# Altium footprint library idc.PcbLib: 45 footprints (part 2 of 3)
Each footprint in its own frame and in the unit in brackets; x right, y up, seen from the top. Pads: shape width x height; smd on the part's side, far side on the other; paste and mask are expansions set on the pad; w line width, h text height; cw(c..) or ccw(c..) is an arc to the next point about the centre after c.
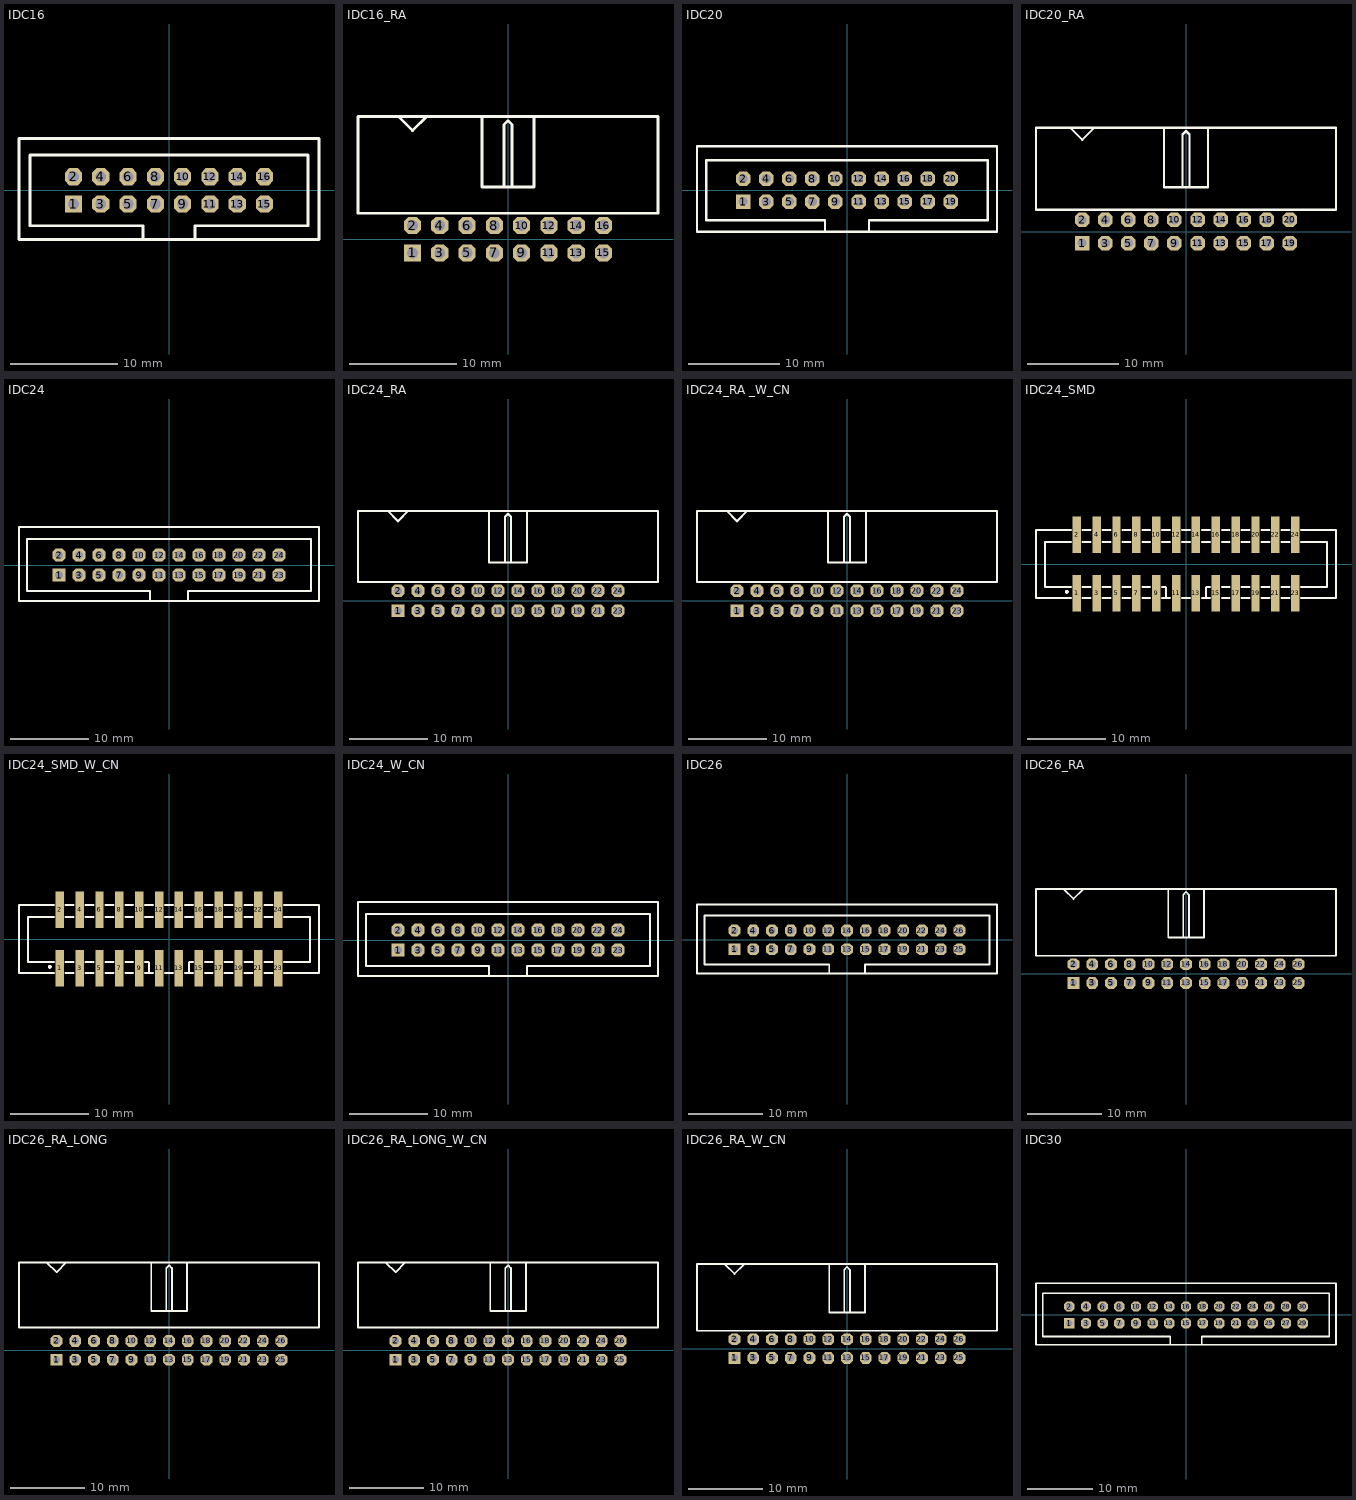
[diagram p1: the footprints below, top view; thin cyan lines are the x and y axes]

## IDC16 [mm] "2.54mm, 16 Pin IDC Male Connector"
height 9.45
pads (16):
  rect 1.6x1.6 hole 1: 1(-8.89,-1.27)
  oct 1.6x1.6 hole 1: 2(-8.89,1.27) 3(-6.35,-1.27) 4(-6.35,1.27) 5(-3.81,-1.27) 6(-3.81,1.27) 7(-1.27,-1.27) 8(-1.27,1.27) 9(1.27,-1.27) 10(1.27,1.27) 11(3.81,-1.27) 12(3.81,1.27) 13(6.35,-1.27) 14(6.35,1.27) 15(8.89,-1.27) 16(8.89,1.27)
Top Overlay:
  lines w0.254: -13.97,-4.572 13.97,-4.572 ; -13.97,-4.5 -13.97,4.826 13.97,4.826 13.97,-4.5 ; -2.413,-4.5 -2.413,-3.302 -12.954,-3.302 -12.954,3.302 12.954,3.302 12.954,-3.302 2.413,-3.302 2.413,-4.5
3D body "Samtec-HTST-108-01-G-D.step": height 9.29, standoff -2.9, extent -13.97,-4.699 13.97,4.699

## IDC16_RA [mm] "2.54mm, 16 Pin IDC Male Connector, Right Angle"
height 9.45
pads (16):
  rect 1.6x1.6 hole 1: 1(-8.89,-1.27)
  oct 1.6x1.6 hole 1: 2(-8.89,1.27) 3(-6.35,-1.27) 4(-6.35,1.27) 5(-3.81,-1.27) 6(-3.81,1.27) 7(-1.27,-1.27) 8(-1.27,1.27) 9(1.27,-1.27) 10(1.27,1.27) 11(3.81,-1.27) 12(3.81,1.27) 13(6.35,-1.27) 14(6.35,1.27) 15(8.89,-1.27) 16(8.89,1.27)
Top Overlay:
  lines w0.254: -10.198,11.417 -8.89,10.109 -7.569,11.43 ; -2.413,11.43 -2.413,4.877 2.413,4.877 ; -0.381,4.877 -0.381,10.668 0,11.049 0.381,10.668 0.381,4.877 ; 2.413,4.928 2.413,11.43 ; -13.97,2.413 -13.97,11.43 13.97,11.43 13.97,2.413 -13.97,2.413
3D body "Samtec-HTST-108-01-G-D-RA.step": height 9.46, standoff -3.24, extent -13.97,-1.524 13.97,11.43

## IDC20 [mm] "2.54mm, 20 Pin IDC Male Connector"
height 9.45
pads (20):
  rect 1.6x1.6 hole 1: 1(-11.43,-1.27)
  oct 1.6x1.6 hole 1: 2(-11.43,1.27) 3(-8.89,-1.27) 4(-8.89,1.27) 5(-6.35,-1.27) 6(-6.35,1.27) 7(-3.81,-1.27) 8(-3.81,1.27) 9(-1.27,-1.27) 10(-1.27,1.27) 11(1.27,-1.27) 12(1.27,1.27) 13(3.81,-1.27) 14(3.81,1.27) 15(6.35,-1.27) 16(6.35,1.27) 17(8.89,-1.27) 18(8.89,1.27) 19(11.43,-1.27) 20(11.43,1.27)
Top Overlay:
  lines w0.254: -16.51,-4.572 16.51,-4.572 ; -16.51,-4.5 -16.51,4.826 16.51,4.826 16.51,-4.5 ; -2.413,-4.5 -2.413,-3.302 -15.494,-3.302 -15.494,3.302 15.494,3.302 15.494,-3.302 2.413,-3.302 2.413,-4.5
3D body "Samtec-HTST-110-01-G-D.STEP": height 9.27, standoff -2.92, extent -16.51,-4.572 16.51,4.902

## IDC20_RA [mm] "2.54mm, 20 Pin IDC Male Connector, Right Angle"
height 9.45
pads (20):
  rect 1.6x1.6 hole 1: 1(-11.43,-1.27)
  oct 1.6x1.6 hole 1: 2(-11.43,1.27) 3(-8.89,-1.27) 4(-8.89,1.27) 5(-6.35,-1.27) 6(-6.35,1.27) 7(-3.81,-1.27) 8(-3.81,1.27) 9(-1.27,-1.27) 10(-1.27,1.27) 11(1.27,-1.27) 12(1.27,1.27) 13(3.81,-1.27) 14(3.81,1.27) 15(6.35,-1.27) 16(6.35,1.27) 17(8.89,-1.27) 18(8.89,1.27) 19(11.43,-1.27) 20(11.43,1.27)
Top Overlay:
  lines w0.254: -12.738,11.417 -11.43,10.109 -10.109,11.43 ; -2.413,11.43 -2.413,4.877 2.413,4.877 ; -0.381,4.877 -0.381,10.668 0,11.049 0.381,10.668 0.381,4.877 ; 2.413,4.928 2.413,11.43 ; -16.51,2.413 -16.51,11.43 16.51,11.43 16.51,2.413 -16.51,2.413
3D body "Samtec-HTST-110-01-G-D-RA.step": height 9.46, standoff -3.24, extent -16.51,-1.524 16.51,11.43

## IDC24 [mm] "2.54mm, 24 Pin IDC Male Connector"
height 9.45
pads (24):
  rect 1.6x1.6 hole 1: 1(-13.97,-1.27)
  oct 1.6x1.6 hole 1: 2(-13.97,1.27) 3(-11.43,-1.27) 4(-11.43,1.27) 5(-8.89,-1.27) 6(-8.89,1.27) 7(-6.35,-1.27) 8(-6.35,1.27) 9(-3.81,-1.27) 10(-3.81,1.27) 11(-1.27,-1.27) 12(-1.27,1.27) 13(1.27,-1.27) 14(1.27,1.27) 15(3.81,-1.27) 16(3.81,1.27) 17(6.35,-1.27) 18(6.35,1.27) 19(8.89,-1.27) 20(8.89,1.27) 21(11.43,-1.27) 22(11.43,1.27) 23(13.97,-1.27) 24(13.97,1.27)
Top Overlay:
  lines w0.254: -19.05,-4.572 19.05,-4.572 ; -19.05,-4.5 -19.05,4.826 19.05,4.826 19.05,-4.5 ; -2.413,-4.5 -2.413,-3.302 -18.034,-3.302 -18.034,3.302 18.034,3.302 18.034,-3.302 2.413,-3.302 2.413,-4.5
3D body "Samtec-HTST-112-01-G-D.step": height 9.29, standoff -2.9, extent -19.05,-4.762 19.05,4.636

## IDC24_RA [mm] "2.54mm, 24 Pin IDC Male Connector, Right Angle"
height 9.45
pads (24):
  rect 1.6x1.6 hole 1: 1(-13.97,-1.27)
  oct 1.6x1.6 hole 1: 2(-13.97,1.27) 3(-11.43,-1.27) 4(-11.43,1.27) 5(-8.89,-1.27) 6(-8.89,1.27) 7(-6.35,-1.27) 8(-6.35,1.27) 9(-3.81,-1.27) 10(-3.81,1.27) 11(-1.27,-1.27) 12(-1.27,1.27) 13(1.27,-1.27) 14(1.27,1.27) 15(3.81,-1.27) 16(3.81,1.27) 17(6.35,-1.27) 18(6.35,1.27) 19(8.89,-1.27) 20(8.89,1.27) 21(11.43,-1.27) 22(11.43,1.27) 23(13.97,-1.27) 24(13.97,1.27)
Top Overlay:
  lines w0.254: -15.278,11.417 -13.97,10.109 -12.649,11.43 ; -2.413,11.43 -2.413,4.877 2.413,4.877 ; -0.381,4.877 -0.381,10.668 0,11.049 0.381,10.668 0.381,4.877 ; 2.413,4.928 2.413,11.43 ; -19.05,2.413 19.05,2.413 19.05,11.43 -19.05,11.43 -19.05,2.413
3D body "Samtec-HTST-112-01-G-D-RA.step": height 9.46, standoff -3.24, extent -19.05,-1.524 19.05,11.43

## IDC24_RA _W_CN [mm] "2.54mm, 24 Pin IDC Male Connector, Right Angle"
height 9.45
pads (24):
  rect 1.6x1.6 hole 1: 1(-13.97,-1.27)
  oct 1.6x1.6 hole 1: 2(-13.97,1.27) 3(-11.43,-1.27) 4(-11.43,1.27) 5(-8.89,-1.27) 6(-8.89,1.27) 7(-6.35,-1.27) 8(-6.35,1.27) 9(-3.81,-1.27) 10(-3.81,1.27) 11(-1.27,-1.27) 12(-1.27,1.27) 13(1.27,-1.27) 14(1.27,1.27) 15(3.81,-1.27) 16(3.81,1.27) 17(6.35,-1.27) 18(6.35,1.27) 19(8.89,-1.27) 20(8.89,1.27) 21(11.43,-1.27) 22(11.43,1.27) 23(13.97,-1.27) 24(13.97,1.27)
Top Overlay:
  lines w0.254: -15.278,11.417 -13.97,10.109 -12.649,11.43 ; -2.413,11.43 -2.413,4.877 2.413,4.877 ; -0.381,4.877 -0.381,10.668 0,11.049 0.381,10.668 0.381,4.877 ; 2.413,4.928 2.413,11.43 ; -19.05,2.413 19.05,2.413 19.05,11.43 -19.05,11.43 -19.05,2.413
3D body "STEP-61202423021-rev1.stp": height 8.86, standoff 2, extent -17.58,5.1 17.58,20.8
3D body "Samtec-HTST-112-01-G-D-RA.step": height 9.46, standoff -3.24, extent -19.05,-1.524 19.05,11.43

## IDC24_SMD [mm] "2.54mm, 24 Pin IDC Male Connector, SMD"
height 9.7
pads (24):
  rect 1.07x4.7 smd: 1(-13.97,-3.746) 2(-13.97,3.746) 3(-11.43,-3.746) 4(-11.43,3.746) 5(-8.89,-3.746) 6(-8.89,3.746) 7(-6.35,-3.746) 8(-6.35,3.746) 9(-3.81,-3.746) 10(-3.81,3.746) 11(-1.27,-3.746) 12(-1.27,3.746) 13(1.27,-3.746) 14(1.27,3.746) 15(3.81,-3.746) 16(3.81,3.746) 17(6.35,-3.746) 18(6.35,3.746) 19(8.89,-3.746) 20(8.89,3.746) 21(11.43,-3.746) 22(11.43,3.746) 23(13.97,-3.746) 24(13.97,3.746)
Top Overlay:
  circle w0.254: c-15.24,-3.556 r0.127
  lines w0.254: -14.732,-4.318 -19.177,-4.318 -19.177,4.318 -14.732,4.318 ; -14.732,-2.921 -18.034,-2.921 -18.034,2.794 -14.732,2.794 ; -13.208,-4.318 -12.192,-4.318 ; -13.208,-2.921 -12.192,-2.921 ; -13.208,2.794 -12.192,2.794 ; -13.208,4.318 -12.192,4.318 ; -10.668,-4.318 -9.652,-4.318 ; -10.668,-2.921 -9.652,-2.921 ; -10.668,2.794 -9.652,2.794 ; -10.668,4.318 -9.652,4.318 ; -8.128,-4.318 -7.112,-4.318 ; -8.128,-2.921 -7.112,-2.921 ; -8.128,2.794 -7.112,2.794 ; -8.128,4.318 -7.112,4.318 ; -5.588,-4.318 -4.572,-4.318 ; -5.588,-2.921 -4.572,-2.921 ; -5.588,2.794 -4.572,2.794 ; -5.588,4.318 -4.572,4.318 ; -3.048,-4.318 -2.032,-4.318 ; -3.048,-2.921 -2.667,-2.921 -2.54,-3.048 -2.54,-4.246 ; -3.048,2.794 -2.032,2.794 ; -3.048,4.318 -2.032,4.318 ; -0.508,-4.318 0.508,-4.318 ; -0.508,2.794 0.508,2.794 ; -0.508,4.318 0.508,4.318 ; 2.032,-4.318 3.048,-4.318 ; 2.032,2.794 3.048,2.794 ; 2.032,4.318 3.048,4.318 ; 2.54,-4.246 2.54,-3.048 2.667,-2.921 3.048,-2.921 ; 4.572,-4.318 5.588,-4.318 ; 4.572,-2.921 5.588,-2.921 ; 4.572,2.794 5.588,2.794 ; 4.572,4.318 5.588,4.318 ; 7.112,-4.318 8.128,-4.318 ; 7.112,-2.921 8.128,-2.921 ; 7.112,2.794 8.128,2.794 ; 7.112,4.318 8.128,4.318 ; 9.652,-4.318 10.668,-4.318 ; 9.652,-2.921 10.668,-2.921 ; 9.652,2.794 10.668,2.794 ; 9.652,4.318 10.668,4.318 ; 12.192,-4.318 13.208,-4.318 ; 12.192,-2.921 13.208,-2.921 ; 12.192,2.794 13.208,2.794 ; 12.192,4.318 13.208,4.318 ; 14.732,-4.318 19.177,-4.318 19.177,4.318 14.732,4.318 ; 14.732,-2.921 18.034,-2.921 18.034,2.794 14.732,2.794
3D body "HTST-112-01-T-DV.stp": height 10.14, standoff -0.02, extent -19.05,-5.588 19.05,5.588

## IDC24_SMD_W_CN [mm] "2.54mm, 24 Pin IDC Male Connector, SMD"
height 9.7
pads (24):
  rect 1.07x4.7 smd: 1(-13.97,-3.746) 2(-13.97,3.746) 3(-11.43,-3.746) 4(-11.43,3.746) 5(-8.89,-3.746) 6(-8.89,3.746) 7(-6.35,-3.746) 8(-6.35,3.746) 9(-3.81,-3.746) 10(-3.81,3.746) 11(-1.27,-3.746) 12(-1.27,3.746) 13(1.27,-3.746) 14(1.27,3.746) 15(3.81,-3.746) 16(3.81,3.746) 17(6.35,-3.746) 18(6.35,3.746) 19(8.89,-3.746) 20(8.89,3.746) 21(11.43,-3.746) 22(11.43,3.746) 23(13.97,-3.746) 24(13.97,3.746)
Top Overlay:
  circle w0.254: c-15.24,-3.556 r0.127
  lines w0.254: -14.732,-4.318 -19.177,-4.318 -19.177,4.318 -14.732,4.318 ; -14.732,-2.921 -18.034,-2.921 -18.034,2.794 -14.732,2.794 ; -13.208,-4.318 -12.192,-4.318 ; -13.208,-2.921 -12.192,-2.921 ; -13.208,2.794 -12.192,2.794 ; -13.208,4.318 -12.192,4.318 ; -10.668,-4.318 -9.652,-4.318 ; -10.668,-2.921 -9.652,-2.921 ; -10.668,2.794 -9.652,2.794 ; -10.668,4.318 -9.652,4.318 ; -8.128,-4.318 -7.112,-4.318 ; -8.128,-2.921 -7.112,-2.921 ; -8.128,2.794 -7.112,2.794 ; -8.128,4.318 -7.112,4.318 ; -5.588,-4.318 -4.572,-4.318 ; -5.588,-2.921 -4.572,-2.921 ; -5.588,2.794 -4.572,2.794 ; -5.588,4.318 -4.572,4.318 ; -3.048,-4.318 -2.032,-4.318 ; -3.048,-2.921 -2.667,-2.921 -2.54,-3.048 -2.54,-4.246 ; -3.048,2.794 -2.032,2.794 ; -3.048,4.318 -2.032,4.318 ; -0.508,-4.318 0.508,-4.318 ; -0.508,2.794 0.508,2.794 ; -0.508,4.318 0.508,4.318 ; 2.032,-4.318 3.048,-4.318 ; 2.032,2.794 3.048,2.794 ; 2.032,4.318 3.048,4.318 ; 2.54,-4.246 2.54,-3.048 2.667,-2.921 3.048,-2.921 ; 4.572,-4.318 5.588,-4.318 ; 4.572,-2.921 5.588,-2.921 ; 4.572,2.794 5.588,2.794 ; 4.572,4.318 5.588,4.318 ; 7.112,-4.318 8.128,-4.318 ; 7.112,-2.921 8.128,-2.921 ; 7.112,2.794 8.128,2.794 ; 7.112,4.318 8.128,4.318 ; 9.652,-4.318 10.668,-4.318 ; 9.652,-2.921 10.668,-2.921 ; 9.652,2.794 10.668,2.794 ; 9.652,4.318 10.668,4.318 ; 12.192,-4.318 13.208,-4.318 ; 12.192,-2.921 13.208,-2.921 ; 12.192,2.794 13.208,2.794 ; 12.192,4.318 13.208,4.318 ; 14.732,-4.318 19.177,-4.318 19.177,4.318 14.732,4.318 ; 14.732,-2.921 18.034,-2.921 18.034,2.794 14.732,2.794
3D body "STEP-61202423021-rev1.stp": height 19.7, standoff 4, extent -17.58,-3.86 17.58,3
3D body "HTST-112-01-T-DV.stp": height 10.14, standoff -0.02, extent -19.05,-5.588 19.05,5.588

## IDC24_W_CN [mm] "2.54mm, 24 Pin IDC Male Connector"
height 9.45
pads (24):
  rect 1.6x1.6 hole 1: 1(-13.97,-1.27)
  oct 1.6x1.6 hole 1: 2(-13.97,1.27) 3(-11.43,-1.27) 4(-11.43,1.27) 5(-8.89,-1.27) 6(-8.89,1.27) 7(-6.35,-1.27) 8(-6.35,1.27) 9(-3.81,-1.27) 10(-3.81,1.27) 11(-1.27,-1.27) 12(-1.27,1.27) 13(1.27,-1.27) 14(1.27,1.27) 15(3.81,-1.27) 16(3.81,1.27) 17(6.35,-1.27) 18(6.35,1.27) 19(8.89,-1.27) 20(8.89,1.27) 21(11.43,-1.27) 22(11.43,1.27) 23(13.97,-1.27) 24(13.97,1.27)
Top Overlay:
  lines w0.254: -19.05,-4.572 19.05,-4.572 ; -19.05,-4.5 -19.05,4.826 19.05,4.826 19.05,-4.5 ; -2.413,-4.5 -2.413,-3.302 -18.034,-3.302 -18.034,3.302 18.034,3.302 18.034,-3.302 2.413,-3.302 2.413,-4.5
3D body "Samtec-HTST-112-01-G-D.step": height 9.29, standoff -2.9, extent -19.05,-4.762 19.05,4.636
3D body "STEP-61202423021-rev1.stp": height 18.7, standoff 3, extent -17.58,-3.86 17.58,3

## IDC26 [mm] "2.54mm, 26 Pin IDC Male Connector"
height 9.45
pads (26):
  rect 1.6x1.6 hole 1: 1(-15.24,-1.27)
  oct 1.6x1.6 hole 1: 2(-15.24,1.27) 3(-12.7,-1.27) 4(-12.7,1.27) 5(-10.16,-1.27) 6(-10.16,1.27) 7(-7.62,-1.27) 8(-7.62,1.27) 9(-5.08,-1.27) 10(-5.08,1.27) 11(-2.54,-1.27) 12(-2.54,1.27) 13(0,-1.27) 14(0,1.27) 15(2.54,-1.27) 16(2.54,1.27) 17(5.08,-1.27) 18(5.08,1.27) 19(7.62,-1.27) 20(7.62,1.27) 21(10.16,-1.27) 22(10.16,1.27) 23(12.7,-1.27) 24(12.7,1.27) 25(15.24,-1.27) 26(15.24,1.27)
Top Overlay:
  lines w0.254: -20.32,-4.572 20.32,-4.572 ; -20.32,-4.5 -20.32,4.826 20.32,4.826 20.32,-4.5 ; -2.413,-4.5 -2.413,-3.302 -19.304,-3.302 -19.304,3.302 19.304,3.302 19.304,-3.302 2.413,-3.302 2.413,-4.5
3D body "Samtec-HTST-113-01-G-D.step": height 9.29, standoff -2.9, extent -20.32,-4.762 20.32,4.636

## IDC26_RA [mm] "2.54mm, 26 Pin IDC Male Connector, Right Angle"
height 9.45
pads (26):
  rect 1.6x1.6 hole 1: 1(-15.24,-1.27)
  oct 1.6x1.6 hole 1: 2(-15.24,1.27) 3(-12.7,-1.27) 4(-12.7,1.27) 5(-10.16,-1.27) 6(-10.16,1.27) 7(-7.62,-1.27) 8(-7.62,1.27) 9(-5.08,-1.27) 10(-5.08,1.27) 11(-2.54,-1.27) 12(-2.54,1.27) 13(0,-1.27) 14(0,1.27) 15(2.54,-1.27) 16(2.54,1.27) 17(5.08,-1.27) 18(5.08,1.27) 19(7.62,-1.27) 20(7.62,1.27) 21(10.16,-1.27) 22(10.16,1.27) 23(12.7,-1.27) 24(12.7,1.27) 25(15.24,-1.27) 26(15.24,1.27)
Top Overlay:
  lines w0.254: -16.548,11.417 -15.24,10.109 -13.919,11.43 ; -2.413,11.43 -2.413,4.877 2.413,4.877 ; -0.381,4.877 -0.381,10.668 0,11.049 0.381,10.668 0.381,4.877 ; 2.413,4.928 2.413,11.43 ; -20.32,2.413 -20.32,11.43 20.32,11.43 20.32,2.413 -20.32,2.413
3D body "Samtec-HTST-113-01-G-D-RA.step": height 9.46, standoff -3.24, extent -20.32,-1.524 20.32,11.43

## IDC26_RA_LONG [mm] "2.54mm, 26 Pin IDC Male Connector, Right Angle"
height 9.45
pads (26):
  rect 1.6x1.6 hole 1: 1(-15.24,-1.27)
  oct 1.6x1.6 hole 1: 2(-15.24,1.27) 3(-12.7,-1.27) 4(-12.7,1.27) 5(-10.16,-1.27) 6(-10.16,1.27) 7(-7.62,-1.27) 8(-7.62,1.27) 9(-5.08,-1.27) 10(-5.08,1.27) 11(-2.54,-1.27) 12(-2.54,1.27) 13(0,-1.27) 14(0,1.27) 15(2.54,-1.27) 16(2.54,1.27) 17(5.08,-1.27) 18(5.08,1.27) 19(7.62,-1.27) 20(7.62,1.27) 21(10.16,-1.27) 22(10.16,1.27) 23(12.7,-1.27) 24(12.7,1.27) 25(15.24,-1.27) 26(15.24,1.27)
Top Overlay:
  lines w0.254: -16.535,11.887 -15.227,10.579 -13.906,11.9 ; -2.4,11.9 -2.4,5.347 2.426,5.347 ; -0.368,5.347 -0.368,11.138 0.013,11.519 0.394,11.138 0.394,5.347 ; 2.426,5.398 2.426,11.9 ; -20.32,3.1 20.32,3.1 20.32,11.9 -20.32,11.9 -20.32,3.1
3D body "61202621721 (rev1).stp": height 9.13, standoff -2.7, extent -20.374,-1.636 20.306,11.914
3D body: height 0.25, standoff 0, extent -6.9,9.3 -6.9,9.3

## IDC26_RA_LONG_W_CN [mm] "2.54mm, 26 Pin IDC Male Connector, Right Angle"
height 9.45
pads (26):
  rect 1.6x1.6 hole 1: 1(-15.24,-1.27)
  oct 1.6x1.6 hole 1: 2(-15.24,1.27) 3(-12.7,-1.27) 4(-12.7,1.27) 5(-10.16,-1.27) 6(-10.16,1.27) 7(-7.62,-1.27) 8(-7.62,1.27) 9(-5.08,-1.27) 10(-5.08,1.27) 11(-2.54,-1.27) 12(-2.54,1.27) 13(0,-1.27) 14(0,1.27) 15(2.54,-1.27) 16(2.54,1.27) 17(5.08,-1.27) 18(5.08,1.27) 19(7.62,-1.27) 20(7.62,1.27) 21(10.16,-1.27) 22(10.16,1.27) 23(12.7,-1.27) 24(12.7,1.27) 25(15.24,-1.27) 26(15.24,1.27)
Top Overlay:
  lines w0.254: -16.535,11.887 -15.227,10.579 -13.906,11.9 ; -2.4,11.9 -2.4,5.347 2.426,5.347 ; -0.368,5.347 -0.368,11.138 0.013,11.519 0.394,11.138 0.394,5.347 ; 2.426,5.398 2.426,11.9 ; -20.32,3.1 20.32,3.1 20.32,11.9 -20.32,11.9 -20.32,3.1
3D body "61202621721 (rev1).stp": height 9.13, standoff -2.7, extent -20.374,-1.636 20.306,11.914
3D body: height 0.25, standoff 0, extent -6.9,9.3 -6.9,9.3
3D body "STEP-61202623021-rev1.stp": height 8.86, standoff 2, extent -18.75,5.6 18.95,21.3

## IDC26_RA_W_CN [mm] "2.54mm, 26 Pin IDC Male Connector, Right Angle"
height 9.45
pads (26):
  rect 1.6x1.6 hole 1: 1(-15.24,-1.27)
  oct 1.6x1.6 hole 1: 2(-15.24,1.27) 3(-12.7,-1.27) 4(-12.7,1.27) 5(-10.16,-1.27) 6(-10.16,1.27) 7(-7.62,-1.27) 8(-7.62,1.27) 9(-5.08,-1.27) 10(-5.08,1.27) 11(-2.54,-1.27) 12(-2.54,1.27) 13(0,-1.27) 14(0,1.27) 15(2.54,-1.27) 16(2.54,1.27) 17(5.08,-1.27) 18(5.08,1.27) 19(7.62,-1.27) 20(7.62,1.27) 21(10.16,-1.27) 22(10.16,1.27) 23(12.7,-1.27) 24(12.7,1.27) 25(15.24,-1.27) 26(15.24,1.27)
Top Overlay:
  lines w0.254: -16.548,11.417 -15.24,10.109 -13.919,11.43 ; -2.413,11.43 -2.413,4.877 2.413,4.877 ; -0.381,4.877 -0.381,10.668 0,11.049 0.381,10.668 0.381,4.877 ; 2.413,4.928 2.413,11.43 ; -20.32,2.413 -20.32,11.43 20.32,11.43 20.32,2.413 -20.32,2.413
3D body "STEP-61202623021-rev1.stp": height 8.86, standoff 2, extent -18.85,5.08 18.85,20.78
3D body "Samtec-HTST-113-01-G-D-RA.step": height 9.46, standoff -3.24, extent -20.32,-1.524 20.32,11.43

## IDC30 [mm] "2.54mm, 30 Pin IDC Male Connector"
height 9.45
pads (30):
  rect 1.6x1.6 hole 1: 1(-17.78,-1.27)
  oct 1.6x1.6 hole 1: 2(-17.78,1.27) 3(-15.24,-1.27) 4(-15.24,1.27) 5(-12.7,-1.27) 6(-12.7,1.27) 7(-10.16,-1.27) 8(-10.16,1.27) 9(-7.62,-1.27) 10(-7.62,1.27) 11(-5.08,-1.27) 12(-5.08,1.27) 13(-2.54,-1.27) 14(-2.54,1.27) 15(0,-1.27) 16(0,1.27) 17(2.54,-1.27) 18(2.54,1.27) 19(5.08,-1.27) 20(5.08,1.27) 21(7.62,-1.27) 22(7.62,1.27) 23(10.16,-1.27) 24(10.16,1.27) 25(12.7,-1.27) 26(12.7,1.27) 27(15.24,-1.27) 28(15.24,1.27) 29(17.78,-1.27) 30(17.78,1.27)
Top Overlay:
  lines w0.254: -22.86,-4.572 22.86,-4.572 ; -22.86,-4.5 -22.86,4.826 22.86,4.826 22.86,-4.5 ; -2.413,-4.5 -2.413,-3.302 -21.844,-3.302 -21.844,3.302 21.844,3.302 21.844,-3.302 2.413,-3.302 2.413,-4.5
3D body "Samtec-HTST-115-01-G-D.step": height 9.29, standoff -2.9, extent -22.86,-4.762 22.86,4.636